# Altium footprint library Footprints.PcbLib: 266 footprints (part 17 of 17)
Each footprint in its own frame and in the unit in brackets; x right, y up, seen from the top. Pads: shape width x height; smd on the part's side, far side on the other; paste and mask are expansions set on the pad; w line width, h text height; cw(c..) or ccw(c..) is an arc to the next point about the centre after c.
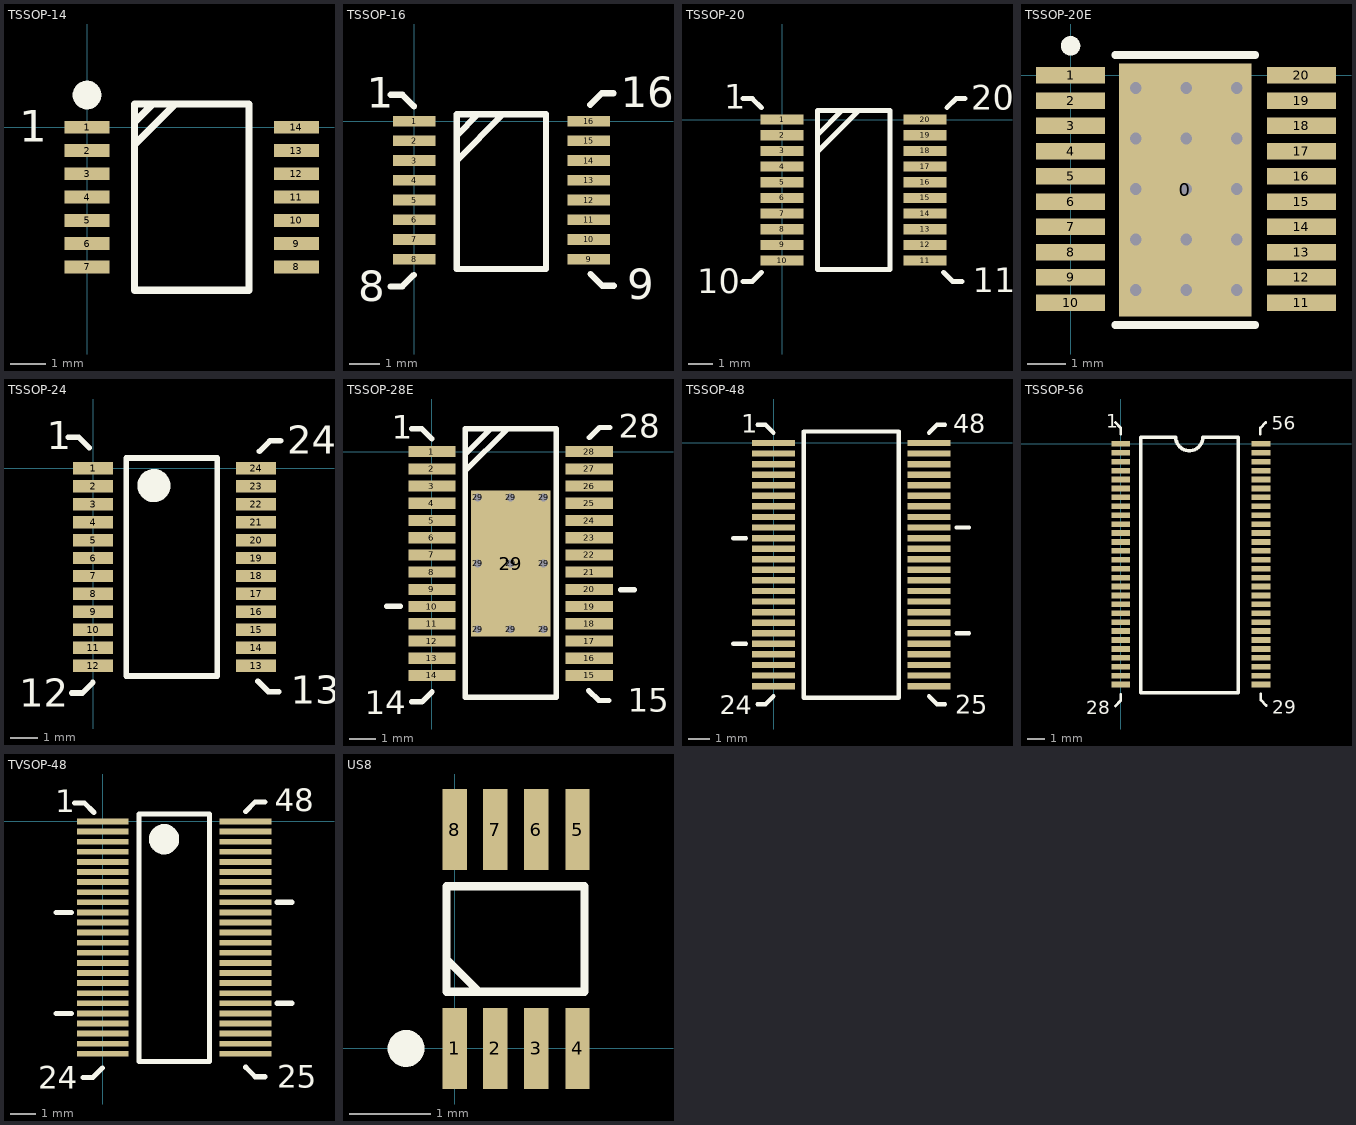
[diagram p16: the footprints below, top view; thin cyan lines are the x and y axes]

## TSSOP-14 [mm] "TSSOP, 14-Leads, Pitch 0.65mm"
pads (14):
  rect 1.26x0.36 smd: 1(0,0) 2(0,-0.65) 3(0,-1.3) 4(0,-1.95) 5(0,-2.6) 6(0,-3.25) 7(0,-3.9) 8(5.85,-3.9) 9(5.85,-3.25) 10(5.85,-2.6) 11(5.85,-1.95) 12(5.85,-1.3) 13(5.85,-0.65) 14(5.85,0)
Top Overlay:
  circle w0.4: c0,0.9 r0.2
  lines w0.203: 1.325,-0.493 2.468,0.65 ; 1.325,0.142 1.833,0.65 ; 1.325,-4.55 1.325,0.65 4.525,0.65 4.525,-4.55 1.325,-4.55
  text "1" at -1.9,-0.4 h0.89
3D body "SW3dPS-TSSOP14-1.STEP": height 1.1, standoff 0, extent -0.279,-4.445 6.121,0.555

## TSSOP-16 [mm] "THIN SHRINK SMALL OTLINE PACKAGE; 16 LEADS"
pads (16):
  rect 1.4x0.35 smd: 1(0,0) 2(0,-0.65) 3(0,-1.3) 4(0,-1.95) 5(0,-2.6) 6(0,-3.25) 7(0,-3.9) 8(0,-4.55) 9(5.75,-4.55) 10(5.75,-3.9) 11(5.75,-3.25) 12(5.75,-2.6) 13(5.75,-1.95) 14(5.75,-1.3) 15(5.75,-0.65) 16(5.75,0)
Top Overlay:
  lines w0.203: -0.773,-5.449 -0.392,-5.449 -0.011,-5.068 ; -0.773,0.869 -0.392,0.869 -0.011,0.488 ; 1.397,-1.3 2.922,0.225 ; 1.397,-0.475 2.097,0.225 ; 5.798,0.539 6.179,0.92 6.56,0.92 ; 5.811,-5.042 6.192,-5.423 6.573,-5.423 ; 1.397,-4.875 1.397,0.225 4.343,0.225 4.343,-4.875 1.397,-4.875
  text "9" at 7.014,-5.871 h1.02
  text "16" at 6.811,0.453 h1.02
  text "8" at -1.854,-5.944 h1.02
  text "1" at -1.561,0.437 h1.02
3D body "User Library-TSSOP-16 5_1x4_4.STEP": height 1.1, standoff 0, extent -0.33,-4.821 6.07,0.279

## TSSOP-20 [mm] "TSSOP, 20-Leads, Pitch 0.65mm"
height 1.05
pads (20):
  rect 1.78x0.42 smd: 1(0,0) 2(0,-0.65) 3(0,-1.3) 4(0,-1.95) 5(0,-2.6) 6(0,-3.25) 7(0,-3.9) 8(0,-4.55) 9(0,-5.2) 10(0,-5.85) 11(5.94,-5.85) 12(5.94,-5.2) 13(5.94,-4.55) 14(5.94,-3.9) 15(5.94,-3.25) 16(5.94,-2.6) 17(5.94,-1.95) 18(5.94,-1.3) 19(5.94,-0.65) 20(5.94,0)
Top Overlay:
  lines w0.203: -1.612,-6.719 -1.231,-6.719 -0.85,-6.338 ; -1.612,0.869 -1.231,0.869 -0.85,0.488 ; 1.476,-1.325 3.176,0.375 ; 1.476,-0.625 2.476,0.375 ; 6.7,-6.338 7.081,-6.719 7.462,-6.719 ; 6.84,0.488 7.221,0.869 7.602,0.869 ; 1.476,-6.225 4.476,-6.225 4.476,0.375 1.476,0.375 1.476,-6.225
  text "1" at -2.399,0.437 h1.02
  text "10" at -3.527,-7.218 h1.02
  text "20" at 7.853,0.402 h1.02
  text "11" at 7.903,-7.167 h1.02
3D body "TSSOP-20.STEP": height 0.97, standoff -0.03, extent -0.229,-6.171 6.181,0.329

## TSSOP-20E [mm] "TSSOP, 20-Leads, Pitch 0,65mm, With Thermal Pad"
height 1.1
pads (21):
  rect 3.4x6.5 smd paste-1016 mask-10.16: 0(2.95,-2.95)
  rect 1.78x0.42 smd: 1(0,0) 2(0,-0.65) 3(0,-1.3) 4(0,-1.95) 5(0,-2.6) 6(0,-3.25) 7(0,-3.9) 8(0,-4.55) 9(0,-5.2) 10(0,-5.85) 11(5.94,-5.85) 12(5.94,-5.2) 13(5.94,-4.55) 14(5.94,-3.9) 15(5.94,-3.25) 16(5.94,-2.6) 17(5.94,-1.95) 18(5.94,-1.3) 19(5.94,-0.65) 20(5.94,0)
via 1.675,-0.325 diameter 0.559 hole 0.3
via 2.975,-0.325 diameter 0.559 hole 0.3
via 4.275,-0.325 diameter 0.559 hole 0.3
via 4.275,-1.625 diameter 0.559 hole 0.3
via 2.975,-1.625 diameter 0.559 hole 0.3
via 1.675,-1.625 diameter 0.559 hole 0.3
via 1.675,-2.925 diameter 0.559 hole 0.3
via 2.975,-2.925 diameter 0.559 hole 0.3
via 4.275,-2.925 diameter 0.559 hole 0.3
via 1.675,-4.225 diameter 0.559 hole 0.3
via 2.975,-4.225 diameter 0.559 hole 0.3
via 4.275,-4.225 diameter 0.559 hole 0.3
via 4.275,-5.525 diameter 0.559 hole 0.3
via 2.975,-5.525 diameter 0.559 hole 0.3
via 1.675,-5.525 diameter 0.559 hole 0.3
Top Overlay:
  circle w0.25: c0,0.76 r0.125
  lines w0.2: 1.15,-6.425 4.75,-6.425 ; 1.15,0.525 4.75,0.525
Top Paste:
  region: 4.175,-4.725 4.175,-1.025 1.775,-1.025 1.775,-4.725
Top Solder:
  rectangle: 1.775,-4.725 4.175,-1.025
3D body "TSSOP20_TP.STEP": height 1.1, standoff -0.09, extent -0.165,-6.275 6.115,0.225

## TSSOP-24 [mm] "TSSOP, 24-Leads, Body 7,9x4,5mm (max), Pitch 0,65mm, IPC Medium Density"
height 1.2
pads (24):
  rect 1.45x0.45 smd: 1(0,0) 2(0,-0.65) 3(0,-1.3) 4(0,-1.95) 5(0,-2.6) 6(0,-3.25) 7(0,-3.9) 8(0,-4.55) 9(0,-5.2) 10(0,-5.85) 11(0,-6.5) 12(0,-7.15) 13(5.9,-7.15) 14(5.9,-6.5) 15(5.9,-5.85) 16(5.9,-5.2) 17(5.9,-4.55) 18(5.9,-3.9) 19(5.9,-3.25) 20(5.9,-2.6) 21(5.9,-1.95) 22(5.9,-1.3) 23(5.9,-0.65) 24(5.9,0)
Top Overlay:
  circle w0.6: c2.2,-0.625 r0.3
  lines w0.2: 1.2,-7.525 4.5,-7.525 4.5,0.375 1.2,0.375 1.2,-7.525
  lines w0.203: -0.9,1.123 -0.519,1.123 -0.138,0.742 ; -0.773,-8.141 -0.392,-8.141 -0.011,-7.76 ; 5.963,-7.709 6.344,-8.09 6.725,-8.09 ; 6.027,0.615 6.408,0.996 6.789,0.996
  text "1" at -1.688,0.691 h1.02
  text "12" at -2.688,-8.64 h1.02
  text "24" at 7.04,0.529 h1.02
  text "13" at 7.167,-8.538 h1.02
3D body "SW3dPS-AD8400 TSSOP.STEP": height 1.15, standoff -0.03, extent -0.26,-7.526 6.147,0.364

## TSSOP-28E [mm] "TSSOP, 28-Leads, Body 9.8x4.5mm (max), Pitch 0,65mm, Exp PAD"
pads (38):
  rect 1.78x0.42 smd mask+0.076: 1(0,0) 2(0,-0.65) 3(0,-1.3) 4(0,-1.95) 5(0,-2.6) 6(0,-3.25) 7(0,-3.9) 8(0,-4.55) 9(0,-5.2) 10(0,-5.85) 11(0,-6.5) 12(0,-7.15) 13(0,-7.8) 14(0,-8.45) 15(5.94,-8.45) 16(5.94,-7.8) 17(5.94,-7.15) 18(5.94,-6.5) 19(5.94,-5.85) 20(5.94,-5.2) 21(5.94,-4.55) 22(5.94,-3.9) 23(5.94,-3.25) 24(5.94,-2.6) 25(5.94,-1.95) 26(5.94,-1.3) 27(5.94,-0.65) 28(5.94,0)
  round 0.5 hole 0.3: 29(1.727,-6.706) 29(1.727,-4.216) 29(1.727,-1.727) 29(2.972,-6.706) 29(2.972,-4.216) 29(2.972,-1.727) 29(4.216,-6.706) 29(4.216,-4.216) 29(4.216,-1.727)
  rect 3x5.5 smd paste-200 mask+0.076: 29(2.971,-4.223)
Top Overlay:
  lines w0.203: -1.702,-5.842 -1.194,-5.842 ; -0.762,-9.449 -0.381,-9.449 0,-9.068 ; -0.762,0.864 -0.381,0.864 0,0.483 ; 1.25,-0.737 2.85,0.864 ; 1.25,-0.102 2.215,0.864 ; 5.918,-9.017 6.299,-9.398 6.68,-9.398 ; 5.944,0.533 6.325,0.914 6.706,0.914 ; 7.134,-5.208 7.642,-5.208 ; 1.25,-9.271 1.25,0.864 4.699,0.864 4.699,-9.271 1.25,-9.271
  text "15" at 7.391,-9.83 h0.89
  text "14" at -2.54,-9.906 h0.89
  text "28" at 7.061,0.533 h0.89
  text "1" at -1.524,0.483 h0.89
Top Paste:
  rectangle: 1.905,-4.039 2.794,-1.905
  rectangle: 3.15,-4.039 4.039,-1.905
  rectangle: 1.905,-6.528 2.794,-4.394
  rectangle: 3.15,-6.528 4.039,-4.394
3D body "User Library-TSSOP-28 9_8x4_4.STEP": height 1.1, standoff 0, extent -0.228,-9.114 6.172,0.686

## TSSOP-48 [mm] "TSSOP, 48-Leads, Body 12,6x6,2mm (max), Pitch 0,50mm"
height 1.2
pads (48):
  rect 2.05x0.3 smd: 1(0,0) 2(0,-0.5) 3(0,-1) 4(0,-1.5) 5(0,-2) 6(0,-2.5) 7(0,-3) 8(0,-3.5) 9(0,-4) 10(0,-4.5) 11(0,-5) 12(0,-5.5) 13(0,-6) 14(0,-6.5) 15(0,-7) 16(0,-7.5) 17(0,-8) 18(0,-8.5) 19(0,-9) 20(0,-9.5) 21(0,-10) 22(0,-10.5) 23(0,-11) 24(0,-11.5) 25(7.35,-11.5) 26(7.35,-11) 27(7.35,-10.5) 28(7.35,-10) 29(7.35,-9.5) 30(7.35,-9) 31(7.35,-8.5) 32(7.35,-8) 33(7.35,-7.5) 34(7.35,-7) 35(7.35,-6.5) 36(7.35,-6) 37(7.35,-5.5) 38(7.35,-5) 39(7.35,-4.5) 40(7.35,-4) 41(7.35,-3.5) 42(7.35,-3) 43(7.35,-2.5) 44(7.35,-2) 45(7.35,-1.5) 46(7.35,-1) 47(7.35,-0.5) 48(7.35,0)
Top Overlay:
  lines w0.2: 1.425,-12.05 1.425,0.55 5.925,0.55 5.925,-12.05 1.425,-12.05
  lines w0.203: -1.9,-9.5 -1.3,-9.5 ; -1.9,-4.5 -1.3,-4.5 ; -0.762,-12.364 -0.381,-12.364 0,-11.983 ; -0.762,0.864 -0.381,0.864 0,0.483 ; 7.35,-11.983 7.731,-12.364 8.112,-12.364 ; 7.35,0.483 7.731,0.864 8.112,0.864 ; 8.65,-9 9.25,-9 ; 8.65,-4 9.25,-4
  text "48" at 8.5,0.483 h0.89
  text "25" at 8.6,-12.8 h0.89
  text "24" at -2.54,-12.821 h0.89
  text "1" at -1.524,0.483 h0.89
3D body "SW3dPS-TSSOP-48.STEP": height 1.1, standoff 0, extent -0.367,-11.99 7.733,0.51

## TSSOP-56 [mm]
pads (56):
  rect 1.05x0.32 smd: 1(0,0) 2(0,-0.5) 3(0,-1) 4(0,-1.5) 5(0,-2) 6(0,-2.5) 7(0,-3) 8(0,-3.5) 9(0,-4) 10(0,-4.5) 11(0,-5) 12(0,-5.5) 13(0,-6) 14(0,-6.5) 15(0,-7) 16(0,-7.5) 17(0,-8) 18(0,-8.5) 19(0,-9) 20(0,-9.5) 21(0,-10) 22(0,-10.5) 23(0,-11) 24(0,-11.5) 25(0,-12) 26(0,-12.5) 27(0,-13) 28(0,-13.5) 29(7.87,-13.5) 30(7.87,-13) 31(7.87,-12.5) 32(7.87,-12) 33(7.87,-11.5) 34(7.87,-11) 35(7.87,-10.5) 36(7.87,-10) 37(7.87,-9.5) 38(7.87,-9) 39(7.87,-8.5) 40(7.87,-8) 41(7.87,-7.5) 42(7.87,-7) 43(7.87,-6.5) 44(7.87,-6) 45(7.87,-5.5) 46(7.87,-5) 47(7.87,-4.5) 48(7.87,-4) 49(7.87,-3.5) 50(7.87,-3) 51(7.87,-2.5) 52(7.87,-2) 53(7.87,-1.5) 54(7.87,-1) 55(7.87,-0.5) 56(7.87,0)
Top Overlay:
  lines w0.152: -0.3,-14.7 0,-14.4 0,-14.05 ; -0.3,1.2 0,0.9 0,0.55 ; 7.829,0.55 7.829,0.9 8.129,1.2 ; 7.854,-14.025 7.854,-14.375 8.154,-14.675
  lines w0.2: 3.083,0.381 ccw(c3.845,0.381) 4.607,0.381 6.579,0.381 6.579,-13.97 1.118,-13.97 1.118,0.381 3.089,0.381
  text "1" at -0.813,0.914 h0.76
  text "28" at -1.95,-15.15 h0.76
  text "29" at 8.504,-15.125 h0.76
  text "56" at 8.479,0.8 h0.76
3D body "SW3dPS-TSSOP-56.STEP": height 1.09, standoff -0.45, extent -0.144,-13.797 8.001,0.284

## TVSOP-48 [mm] "TVSOP, 48-Leads, Body 9,8x4,5mm (max), Pitch 0,40mm, IPC Low Density"
height 1.2
pads (48):
  rect 2.05x0.23 smd: 1(0,0) 2(0,-0.4) 3(0,-0.8) 4(0,-1.2) 5(0,-1.6) 6(0,-2) 7(0,-2.4) 8(0,-2.8) 9(0,-3.2) 10(0,-3.6) 11(0,-4) 12(0,-4.4) 13(0,-4.8) 14(0,-5.2) 15(0,-5.6) 16(0,-6) 17(0,-6.4) 18(0,-6.8) 19(0,-7.2) 20(0,-7.6) 21(0,-8) 22(0,-8.4) 23(0,-8.8) 24(0,-9.2) 25(5.65,-9.2) 26(5.65,-8.8) 27(5.65,-8.4) 28(5.65,-8) 29(5.65,-7.6) 30(5.65,-7.2) 31(5.65,-6.8) 32(5.65,-6.4) 33(5.65,-6) 34(5.65,-5.6) 35(5.65,-5.2) 36(5.65,-4.8) 37(5.65,-4.4) 38(5.65,-4) 39(5.65,-3.6) 40(5.65,-3.2) 41(5.65,-2.8) 42(5.65,-2.4) 43(5.65,-2) 44(5.65,-1.6) 45(5.65,-1.2) 46(5.65,-0.8) 47(5.65,-0.4) 48(5.65,0)
Top Overlay:
  circle w0.6: c2.425,-0.7 r0.3
  lines w0.2: 1.425,-9.5 4.225,-9.5 4.225,0.3 1.425,0.3 1.425,-9.5
  lines w0.203: -1.85,-7.6 -1.25,-7.6 ; -1.85,-3.6 -1.25,-3.6 ; -1.112,0.739 -0.731,0.739 -0.35,0.358 ; -0.777,-10.137 -0.396,-10.137 -0.015,-9.756 ; 5.659,-9.731 6.04,-10.112 6.421,-10.112 ; 5.659,0.398 6.04,0.779 6.421,0.779 ; 6.9,-7.2 7.5,-7.2 ; 6.9,-3.2 7.5,-3.2
  text "48" at 6.809,0.398 h0.89
  text "25" at 6.909,-10.548 h0.89
  text "24" at -2.555,-10.594 h0.89
  text "1" at -1.874,0.358 h0.89

## US8 [mm]
pads (8):
  rect 0.3x1 smd: 1(0,0) 2(0.5,0) 3(1.008,0) 4(1.516,0) 5(1.516,2.7) 6(1.008,2.7) 7(0.5,2.7) 8(0,2.7)
Top Overlay:
  circle w0.254: c-0.6,0 r0.1
  lines w0.1: -0.1,1.1 0.3,0.7 ; -0.1,0.7 -0.1,2 1.6,2 1.6,0.7 -0.1,0.7
3D body "User Library-SOP50P310X90-8N[8US8_VSSOP_DCU_MO-187CA].step": height 0.9, standoff 0, extent -0.3,-0.275 1.8,2.925